# Altium footprint library SYB.PcbLib.PcbLib: 89 footprints (part 1 of 6)
Each footprint in its own frame and in the unit in brackets; x right, y up, seen from the top. Pads: shape width x height; smd on the part's side, far side on the other; paste and mask are expansions set on the pad; w line width, h text height; cw(c..) or ccw(c..) is an arc to the next point about the centre after c.
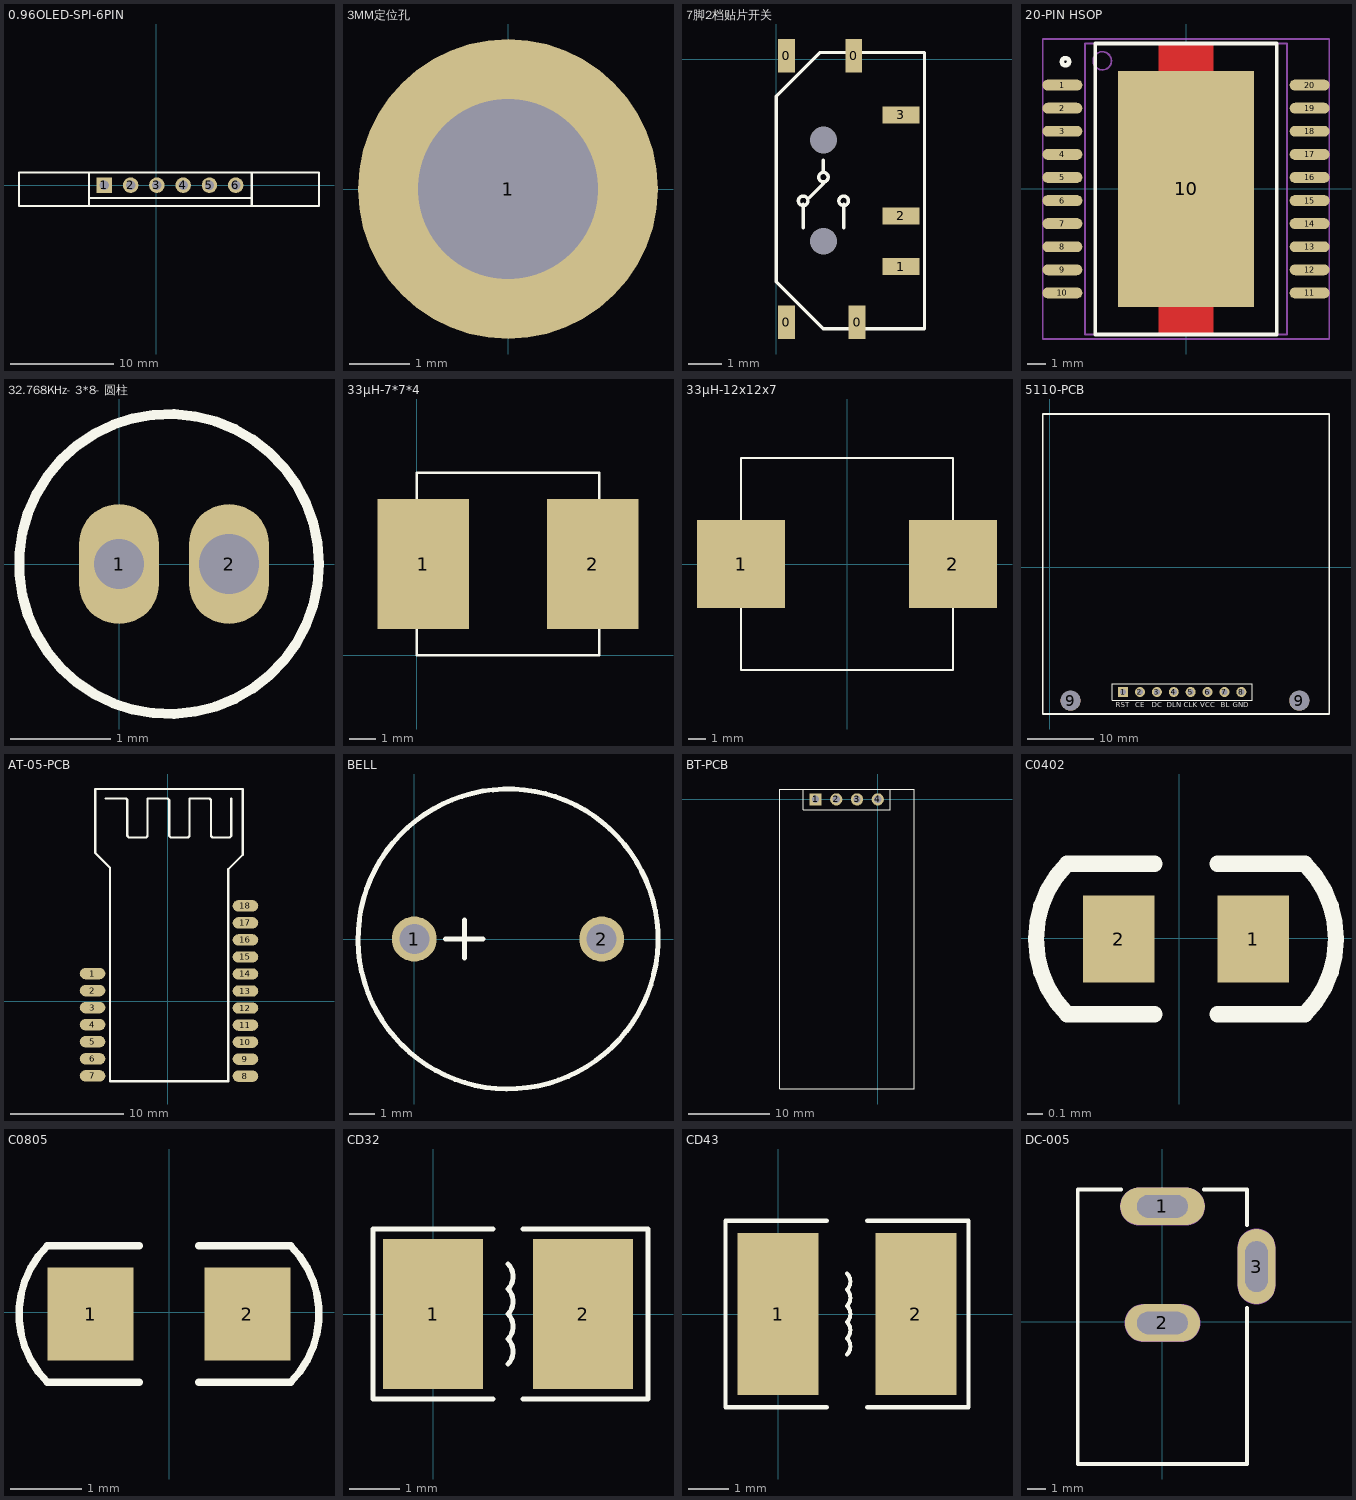
[diagram p0: the footprints below, top view; thin cyan lines are the x and y axes]

## 0.96OLED-SPI-6PIN [mm]
pads (6):
  rect 1.5x1.5 hole 0.9 unplated: 1(-5,0)
  round 1.5 hole 0.9 unplated: 2(-2.46,0) 3(0.08,0) 4(2.62,0)
  round 1.5 hole 0.9: 5(5.16,0) 6(7.7,0)
Top Overlay:
  lines w0.1: -6.5,-1.27 -6.5,1.27 9.25,1.27 9.25,-1.27 -6.5,-1.27
  lines w0.2: -6.5,-2 -6.5,-1.25 ; -6.5,-2 9.25,-2 ; -6.5,-2 -13.25,-2 -13.25,1.25 -6.5,1.25 ; -6.5,-1.25 -6.5,1.25 ; -6.5,-1.25 9.25,-1.25 ; -6.5,1.25 9.25,1.25 ; 9.25,-2 9.25,-1.25 ; 9.25,-2 15.75,-2 15.75,1.25 9.25,1.25 ; 9.25,-1.25 9.25,1.25

## 3MM定位孔 [mm]
pads (1):
  round 5 hole 3: 1(0,0)

## 7脚2档贴片开关 [mm]
pads (9):
  rect 0.5x1 smd: 0(0.3,-7.8) 0(0.3,0.1) 0(2.3,0.1) 0(2.4,-7.8)
  rect 1.1x0.5 smd: 1(3.7,-6.15) 2(3.7,-4.65) 3(3.7,-1.65)
  round 0 hole 0.8: A(1.4,-5.4) A(1.4,-2.4)
Top Overlay:
  circle w0.1: c1.4,-3.5 r0.141
  circle w0.1: c0.8,-4.2 r0.141
  circle w0.1: c2,-4.2 r0.141
  lines w0.1: 0.8,-5 0.8,-4.3 ; 1,-4.1 1.4,-3.7 ; 1.4,-3.3 1.4,-3 ; 2,-5 2,-4.3 ; 0,-6.6 1.4,-8 4.4,-8 4.4,0.2 1.3,0.2 0,-1.1 0,-6.6

## 20-PIN HSOP [mm] "MC33186"
height 2.65
pads (21):
  oval 2.2x0.6 smd: 1(-6.8,5.715) 2(-6.8,4.445) 3(-6.8,3.175) 4(-6.8,1.905) 5(-6.8,0.635) 6(-6.8,-0.635) 7(-6.8,-1.905) 8(-6.8,-3.175) 9(-6.8,-4.445) 10(-6.8,-5.715) 11(6.8,-5.715) 12(6.8,-4.445) 13(6.8,-3.175) 14(6.8,-1.905) 15(6.8,-0.635) 16(6.8,0.635) 17(6.8,1.905) 18(6.8,3.175) 19(6.8,4.445) 20(6.8,5.715)
  rect 7.5x13 smd: 10(0,0)
Top Layer:
  region: -1.5,8 1.5,8 1.5,6.5 -1.5,6.5
  region: -1.5,-6.5 1.5,-6.5 1.5,-8 -1.5,-8
Top Overlay:
  circle w0.25: c-6.625,7 r0.2
  lines w0.2: -5,-8 -5,8 5,8 5,-8 -5,-8
Mechanical 13:
  circle w0.1: c-4.6,7.05 r0.5
  lines w0.1: -5.55,-8 -5.55,8 5.55,8 5.55,-8 -5.55,-8
Mechanical 15:
  lines w0.1: -0.5,0 0.5,0 ; 0,-0.5 0,0.5 ; -7.875,-8.25 -7.875,8.25 7.875,8.25 7.875,-8.25 -7.875,-8.25
3D body: height 2.65, standoff 0.1, extent -5.55,-8 5.55,8

## 32.768KHz- 3*8- 圆柱 [mm] "晶振32.768KHz"
pads (2):
  oval 0.8x1.2 hole 0.5: 1(0,0)
  oval 0.8x1.2 hole 0.6: 2(1.1,0)
Top Overlay:
  circle w0.1: c0.5,0 r1.5

## 33μH-7*7*4 [mm]
pads (2):
  rect 3.5x5 smd: 1(0.25,3.5) 2(6.75,3.5)
Top Overlay:
  lines w0.1: 0,0 0,7 7,7 7,0 0,0

## 33μH-12x12x7 [mm]
pads (2):
  rect 5x5 smd: 1(-6,0) 2(6,0)
Top Overlay:
  lines w0.1: -6,-6 6,-6 6,6 -6,6 -6,-6

## 5110-PCB [mm]
pads (10):
  rect 1.5x1.5 hole 0.9: 1(11,-18.8)
  round 1.5 hole 0.9: 2(13.54,-18.8) 3(16.08,-18.8) 4(18.62,-18.8) 5(21.16,-18.8) 6(23.7,-18.8) 7(26.24,-18.8) 8(28.78,-18.8)
  round 3 hole 3: 9(3.1,-20.1) 9(37.5,-20.1)
Top Overlay:
  lines w0.127: 9.349,-20.07 9.349,-17.53 30.431,-17.53 30.431,-20.07 9.349,-20.07
  lines w0.254: -1.1,-22.1 42.02,-22.1 42.02,23.01 -1.1,23.01 -1.1,-22.1
  text "GND" at 27.5,-21.4 h1.3
  text "BL" at 25.7,-21.414 h1.3
  text "VCC" at 22.6,-21.4 h1.3
  text "CLK" at 20.1,-21.4 h1.3
  text "DLN" at 17.6,-21.414 h1.3
  text "DC" at 15.3,-21.4 h1.3
  text "CE" at 12.8,-21.4 h1.3
  text "RST" at 9.9,-21.4 h1.3

## AT-05-PCB [mm]
pads (18):
  oval 2.254x1 smd: 1(-6.604,2.441) 2(-6.604,0.941) 3(-6.604,-0.559) 4(-6.604,-2.059) 5(-6.604,-3.559) 6(-6.604,-5.059) 7(-6.604,-6.559) 8(6.858,-6.593) 9(6.858,-5.093) 10(6.858,-3.593) 11(6.858,-2.093) 12(6.858,-0.593) 13(6.858,0.907) 14(6.858,2.407) 15(6.858,3.907) 16(6.858,5.407) 17(6.858,6.907) 18(6.858,8.407)
Top Overlay:
  lines w0.2: -5.442,17.853 -3.664,17.853 -3.537,17.726 -3.537,14.551 -3.41,14.424 -1.886,14.424 -1.759,14.551 -1.759,17.853 0.019,17.853 0.146,17.726 0.146,14.551 0.273,14.424 1.797,14.424 1.924,14.551 1.924,17.853 3.702,17.853 3.829,17.726 3.829,14.551 3.956,14.424 5.48,14.424 5.607,14.551 5.607,17.853 ; -6.377,13.073 -6.377,18.691 6.623,18.691 6.623,12.9 5.353,11.63 5.353,-7.039 -5.061,-7.039 -5.061,11.757 -6.377,13.073

## BELL [mm]
pads (2):
  round 1.8 hole 1.2: 1(0,0) 2(7.5,0)
Top Overlay:
  lines w0.2: 1.25,0 2.75,0 ; 2,-0.75 2,0.75 ; 9.743,0.3 ccw(c3.75,0) 9.745,0.25

## BT-PCB [mm] "JY-MCU-BT-BOARD"
pads (4):
  rect 1.5x1.5 hole 0.9 unplated: 1(-7.6,0)
  round 1.5 hole 0.9 unplated: 2(-5.06,0) 3(-2.52,0) 4(0.02,0)
Top Overlay:
  lines w0.1: -9.124,1.27 1.544,1.27 1.544,-1.27 -9.119,-1.27 -9.119,1.275 -12,1.275 -12,-35.458 4.5,-35.458 4.5,1.27 1.549,1.27

## C0402 [mm]
pads (2):
  rect 0.45x0.55 smd: 1(0.467,-0.005) 2(-0.383,-0.005)
Top Overlay:
  lines w0.102: -0.157,-0.48 -0.708,-0.48 cw(c-0.233,-0.005) -0.708,0.47 -0.157,0.47 ; 0.24,-0.48 0.792,-0.48 ccw(c0.317,-0.005) 0.792,0.47 0.24,0.47
3D body: height 0.5, standoff 0, extent -0.458,-0.255 -0.258,0.245
3D body: height 0.5, standoff 0, extent -0.258,-0.255 0.342,0.245
3D body: height 0.5, standoff 0, extent 0.342,-0.255 0.542,0.245

## C0805 [mm]
pads (2):
  rect 1.2x1.3 smd: 1(-1.093,-0.025) 2(1.093,-0.025)
Top Overlay:
  lines w0.1: -1.698,-0.975 cw(c-0.748,-0.025) -1.698,0.925 ; 1.698,-0.975 ccw(c0.748,-0.025) 1.698,0.925
  lines w0.102: -1.698,-0.975 -0.415,-0.975 ; -1.698,0.925 -0.415,0.925 ; 0.415,-0.975 1.698,-0.975 ; 0.415,0.925 1.698,0.925
3D body: height 0.8, standoff 0.02, extent -1,-0.65 1,0.6

## CD32 [mm]
pads (2):
  rect 2x3 smd: 1(0,0) 2(3,0)
Top Overlay:
  lines w0.1: 1.2,-1.7 -1.2,-1.7 -1.2,1.7 1.2,1.7 ; 1.5,-1 ccw(c1.25,-0.75) 1.5,-0.5 ccw(c1.25,-0.25) 1.5,0 ccw(c1.25,0.25) 1.5,0.5 ccw(c1.25,0.75) 1.5,1 ; 1.8,-1.7 4.3,-1.7 4.3,1.7 1.8,1.7

## CD43 [mm]
pads (2):
  rect 2x4 smd: 1(0,0) 2(3.4,0)
Top Overlay:
  lines w0.1: 1.2,-2.3 -1.3,-2.3 -1.3,2.3 1.2,2.3 ; 1.7,-1 ccw(c1.5,-0.8) 1.7,-0.6 ccw(c1.5,-0.4) 1.7,-0.2 ccw(c1.5,0) 1.7,0.2 ccw(c1.5,0.4) 1.7,0.6 ccw(c1.5,0.8) 1.7,1 ; 2.2,-2.3 4.7,-2.3 4.7,2.3 2.2,2.3

## DC-005 [mm] "电源母座"
pads (3):
  oval 4.5x2 hole 1.2 slot 2.7 at 0 deg: 1(0.016,6.126)
  oval 4x2 hole 1.2 slot 2.7 at 0 deg: 2(0.016,-0.074)
  oval 2x4 hole 1.2 slot 2.7 at 90 deg: 3(5.016,2.926)
Top Overlay:
  lines w0.2: -2.184,7.026 -4.484,7.026 -4.484,-7.574 4.516,-7.574 4.516,0.726 ; 2.216,7.026 4.516,7.026 4.516,5.126
Mechanical 1:
  lines w1: -1.234,6.126 1.266,6.126 ; -0.984,-0.074 1.016,-0.074 ; 5.016,1.926 5.016,3.926
  text "Alert PCB fab to slot details" at -6.05,-7.288 h0.3
  text "Assign keep-out area to slot" at -6.55,-7.288 h0.3
  text "Mech 1 - Slot cut-out" at -5.55,-7.288 h0.3
  text "Mech 2 - Clearance, move to internal plane if present" at -5.05,-7.288 h0.3
Mechanical 2:
  lines w2.016: -1.234,6.126 1.266,6.126 ; -0.984,-0.074 1.016,-0.074 ; 5.016,1.926 5.016,3.926